# Altium footprint library ATROTECH.PcbLib: 334 footprints (part 16 of 21)
Each footprint in its own frame and in the unit in brackets; x right, y up, seen from the top. Pads: shape width x height; smd on the part's side, far side on the other; paste and mask are expansions set on the pad; w line width, h text height; cw(c..) or ccw(c..) is an arc to the next point about the centre after c.
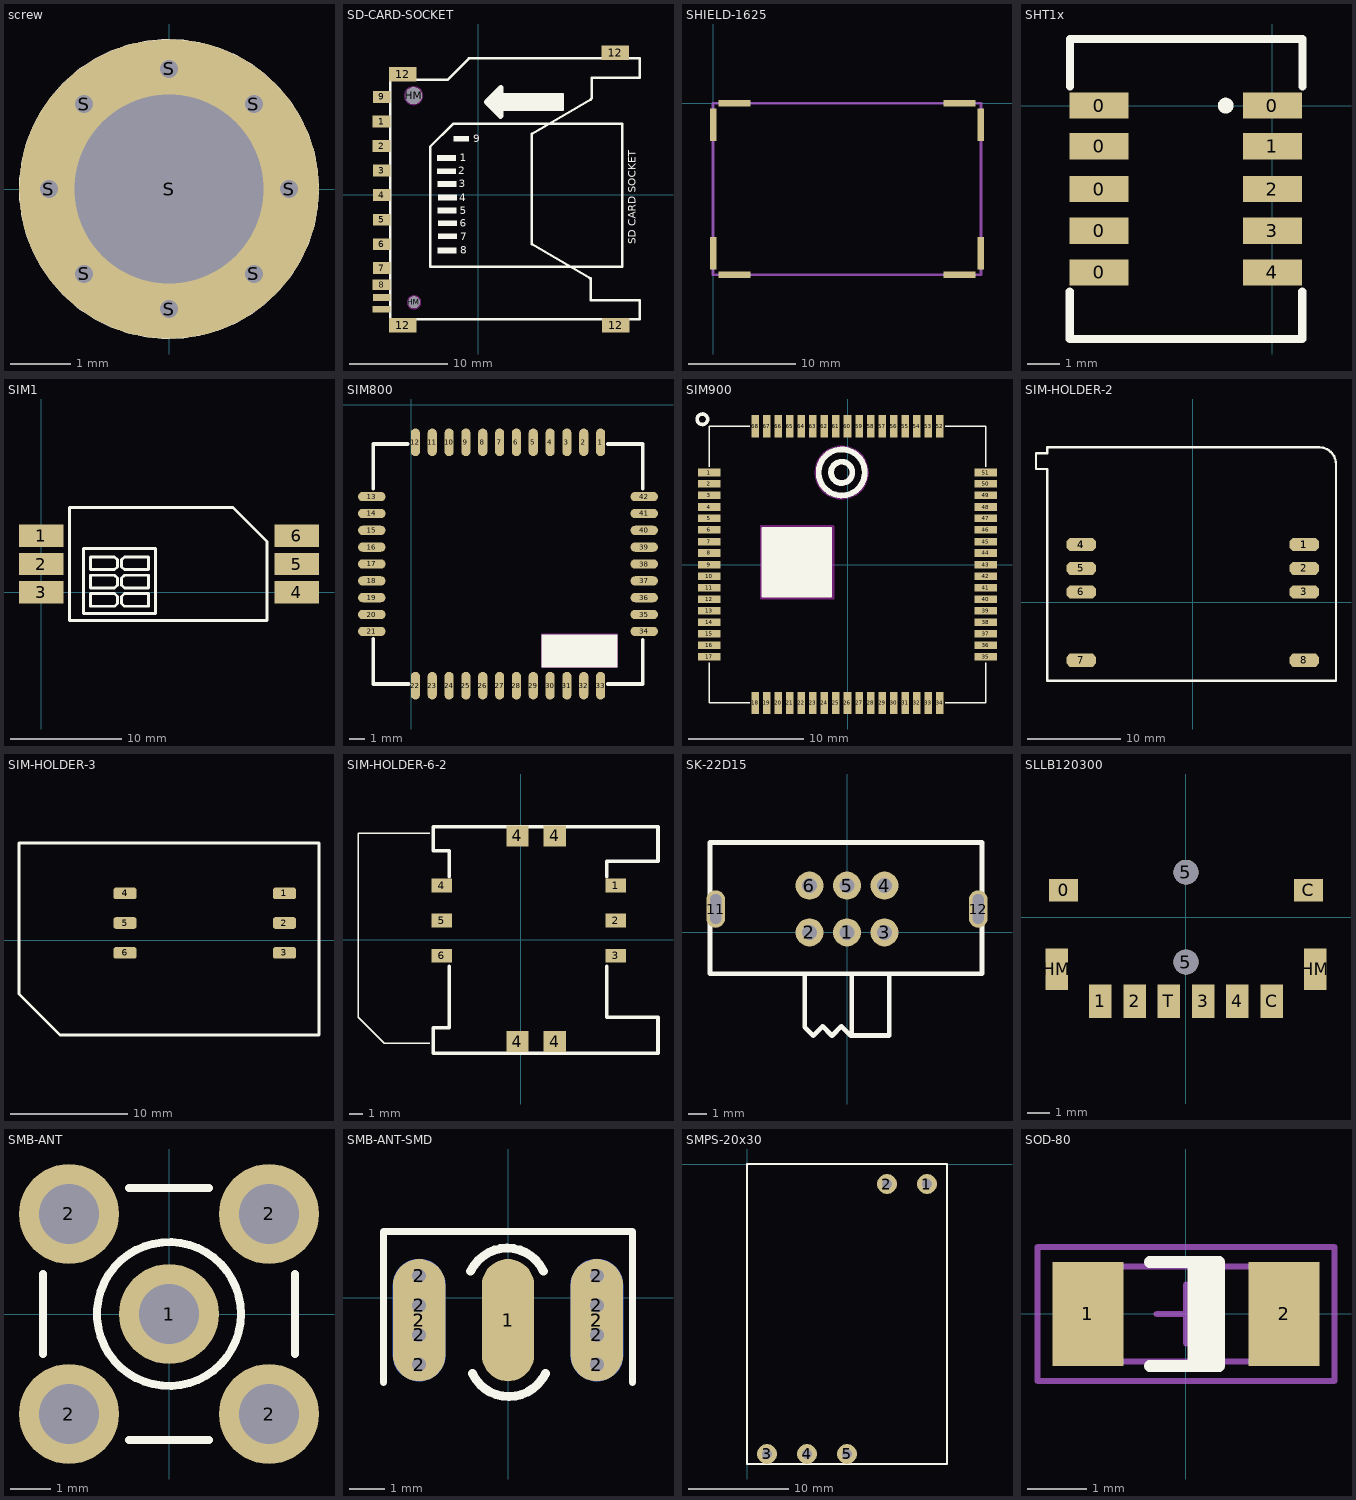
[diagram p15: the footprints below, top view; thin cyan lines are the x and y axes]

## screw [mm]
pads (9):
  round 0.6 hole 0.3: S(-2,0) S(-1.414,-1.414) S(-1.414,1.414) S(0,-2) S(0,2) S(1.414,-1.414) S(1.414,1.414) S(2,0)
  round 5 hole 3.15 mask+0.1: S(0,0)
Top Overlay:
  circle w1: c0,0 r2

## SD-CARD-SOCKET [mm]
pads (17):
  rect 1.8x1.2 smd: 1(-9.864,7.428) 2(-9.864,4.939) 3(-9.855,2.445) 4(-9.855,-0.055) 5(-9.855,-2.555) 6(-9.855,-5.055) 7(-9.855,-7.48) 9(-9.855,9.945)
  rect 1.8x1.1 smd: 8(-9.864,-9.184)
  rect 1.8x0.7 smd: 10(-9.855,-10.48) 11(-9.864,-11.673)
  rect 2.8x1.5 smd: 12(-7.721,-13.298) 12(-7.721,12.254) 12(13.919,14.438) 12(13.97,-13.298)
  round 1.7 hole 1.7: HM(-6.604,10.07)
  round 1.2 hole 1.2: HM(-6.564,-10.962)
Top Overlay:
  rectangle: -4.183,-5.971 -2.247,-5.397
  rectangle: -4.165,-1.903 -2.229,-1.329
  rectangle: -4.129,-0.577 -2.193,-0.003
  rectangle: -4.129,-3.193 -2.193,-2.62
  rectangle: -4.129,-4.519 -2.193,-3.946
  rectangle: -4.165,0.785 -2.229,1.359
  rectangle: -4.2,2.076 -2.265,2.649
  rectangle: -4.2,3.438 -2.265,4.011
  rectangle: -2.552,5.409 -0.975,5.983
  rectangle: 2.287,8.617 8.56,9.029
  rectangle: 2.287,9.334 8.56,10.212
  rectangle: 1.328,8.904 1.911,9.477
  rectangle: 1.328,9.477 2.018,9.952
  rectangle: 1.051,9.173 1.875,9.782
  rectangle: 1.875,8.277 2.287,9.173
  rectangle: 1.57,8.599 2.287,10.409
  rectangle: 2.287,8.922 8.56,9.872
  lines w0.254: -2.014,7.201 -2.588,7.201 ; 2.287,10.158 2.341,10.212 8.56,10.212 8.56,8.617 2.52,8.617 2.466,8.671 ; 5.436,-5.03 5.436,6.17 11.43,9.67 ; 5.436,-5.018 11.43,-8.53 ; 11.272,-8.479 11.43,-8.637 11.43,-10.679 ; 11.379,9.67 11.537,9.828 11.537,11.87 16.436,11.87 16.436,13.843 16.409,13.87 -0.965,13.87 -0.965,13.859 -3.154,11.67 -8.964,11.67 -8.964,-12.689 -8.95,-12.703 16.436,-12.703 16.436,-10.73 11.436,-10.73 ; -2.588,7.201 -4.917,4.872 -4.917,-7.351 -2.838,-7.351 14.653,-7.351 14.653,7.201 -0.473,7.201 -2.588,7.201 ; 2.287,8.922 2.287,9.872 8.56,9.872 8.56,8.922 2.287,8.922
  lines w0.5: 2.287,8.008 2.287,10.911
  lines w0.508: 2.251,7.972 0.8,9.424 2.287,10.911
  text "9" at -0.507,5.308 h0.76
  text "8" at -1.871,-6.025 h0.76
  text "7" at -1.871,-4.663 h0.76
  text "6" at -1.907,-3.265 h0.76
  text "5" at -1.907,-2.01 h0.76
  text "4" at -1.978,-0.684 h0.76
  text "3" at -2.014,0.75 h0.76
  text "2" at -2.05,2.076 h0.76
  text "1" at -1.907,3.402 h0.76
  text "SD CARD SOCKET" at 16.015,-5.057 h0.76
Keep-Out Layer:
  circle w0.254: c-6.604,10.07 r0.85
  circle w0.254: c-6.564,-10.962 r0.6
Mechanical 1:
  text "Data1" at -0.831,-6.061 h0.76
  text "Data OUT" at -0.903,-4.627 h0.76
  text "CLK" at -0.903,-1.903 h0.76
  text "VSS2" at -0.975,-3.337 h0.76
  text "Data IN" at -0.975,2.04 h0.76
  text "VDD" at -1.046,-0.541 h0.76
  text "VSS1" at -1.046,0.678 h0.76
  text "CS" at -0.975,3.402 h0.76
  text "Data2" at -0.831,5.338 h0.76
3D body "socket_a-sd-09-c-0-7-3.stp": height 3.3, standoff -0.85, extent -9.906,-13.509 16.45,14.525

## SHIELD-1625 [mm]
pads (8):
  rect 0.6x3 smd: 0(0,-14) 0(0,-2) 0(25,-14) 0(25,-2)
  rect 3x0.6 smd: 0(2,-16) 0(2,0) 0(23,-16) 0(23,0)
Mechanical 1:
  lines w0.254: 0,-16 0,0 25,0 25,-16 0,-16

## SHT1x [mm]
pads (10):
  rect 1.8x0.8 smd: 0(-5.28,-5.08) 0(-5.28,-3.81) 0(-5.28,-2.54) 0(-5.28,-1.24) 0(-5.28,0) 0(0,0) 1(0,-1.24) 2(0,-2.54) 3(0,-3.81) 4(0,-5.08)
Top Overlay:
  circle w0.254: c-1.422,0 r0.114
  lines w0.254: -6.172,-5.664 -6.172,-7.109 0.908,-7.109 0.908,-5.664 ; -6.166,0.584 -6.166,2.029 0.914,2.029 0.914,0.584

## SIM1 [mm]
pads (6):
  rect 4x2 smd: 1(0,5.08) 2(0,2.54) 3(0,0) 4(23,0) 5(23,2.54) 6(23,5.08)
Top Overlay:
  lines w0.254: 2.54,-2.54 20.32,-2.54 20.32,4.572 17.272,7.62 2.54,7.62 2.54,-2.54 ; 3.81,-1.905 10.287,-1.905 10.287,3.937 3.81,3.937 3.81,-1.905 ; 4.445,-1.27 4.445,-0.127 6.604,-0.127 6.858,-0.381 6.858,-1.016 6.604,-1.27 4.445,-1.27 ; 4.445,0.381 4.445,1.524 6.604,1.524 6.858,1.27 6.858,0.635 6.604,0.381 4.445,0.381 ; 4.445,2.032 6.604,2.032 6.858,2.286 6.858,2.921 6.604,3.175 4.445,3.175 4.445,2.032 ; 7.239,-1.016 7.239,-0.381 7.493,-0.127 9.652,-0.127 9.652,-1.27 7.493,-1.27 7.239,-1.016 ; 7.239,0.635 7.493,0.381 9.652,0.381 9.652,1.524 7.493,1.524 7.239,1.27 7.239,0.635 ; 7.239,2.286 7.493,2.032 9.652,2.032 9.652,3.175 7.493,3.175 7.239,2.921 7.239,2.286

## SIM800 [mm]
pads (42):
  oval 0.6x1.8 smd: 1(12.363,-2.44) 2(11.263,-2.44) 3(10.163,-2.44) 4(9.063,-2.44) 5(7.963,-2.44) 6(6.863,-2.44) 7(5.763,-2.44) 8(4.663,-2.44) 9(3.563,-2.44) 10(2.463,-2.44) 11(1.363,-2.44) 12(0.263,-2.44) 22(0.263,-18.34) 23(1.363,-18.34) 24(2.463,-18.34) 25(3.563,-18.34) 26(4.663,-18.34) 27(5.763,-18.34) 28(6.863,-18.34) 29(7.963,-18.34) 30(9.063,-18.34) 31(10.163,-18.34) 32(11.263,-18.34) 33(12.363,-18.34)
  oval 1.8x0.6 smd: 13(-2.587,-5.99) 14(-2.587,-7.09) 15(-2.587,-8.19) 16(-2.587,-9.29) 17(-2.587,-10.39) 18(-2.587,-11.49) 19(-2.587,-12.59) 20(-2.587,-13.69) 21(-2.587,-14.79) 34(15.213,-14.79) 35(15.213,-13.69) 36(15.213,-12.59) 37(15.213,-11.49) 38(15.213,-10.39) 39(15.213,-9.29) 40(15.213,-8.19) 41(15.213,-7.09) 42(15.213,-5.99)
Top Overlay:
  rectangle: 8.509,-17.136 13.459,-14.986
  lines w0.254: -2.487,-15.293 -2.487,-18.24 -0.175,-18.24 ; -2.487,-5.461 -2.487,-2.54 -0.254,-2.54 ; 12.827,-18.24 15.113,-18.24 15.113,-15.367 ; 12.827,-2.54 15.113,-2.54 15.113,-5.461
Keep-Out Layer:
  lines w0.1: 8.509,-17.145 13.462,-17.145 13.462,-14.986 8.509,-14.986 8.509,-17.145
3D body "User Library-SIM800C.step": height 2.3, standoff -0.01, extent -2.45,-18.264 15.15,-2.564

## SIM900 [mil]
pads (68):
  rect 76x26 smd: 1(-472.72,314.72) 2(-472.72,275.72) 3(-472.72,236.72) 4(-472.72,196.72) 5(-472.72,157.72) 6(-472.72,118.72) 7(-472.72,78.72) 8(-472.72,39.72) 9(-472.72,-0.28) 10(-472.72,-39.65) 11(-472.72,-79.02) 12(-472.72,-118.39) 13(-472.72,-157.76) 14(-472.72,-197.13) 15(-472.72,-236.5) 16(-472.72,-275.87) 17(-472.72,-315.24) 35(472.72,-315.24) 36(472.72,-275.87) 37(472.72,-236.5) 38(472.72,-197.13) 39(472.72,-157.76) 40(472.72,-118.39) 41(472.72,-79.02) 42(472.72,-39.65) 43(472.72,-0.28) 44(472.72,39.72) 45(472.72,78.72) 46(472.72,118.72) 47(472.72,157.72) 48(472.72,196.72) 49(472.72,236.72) 50(472.72,275.72) 51(472.72,314.72)
  rect 26x76 smd: 18(-315.24,-472.72) 19(-275.87,-472.72) 20(-236.5,-472.72) 21(-197.13,-472.72) 22(-157.76,-472.72) 23(-118.39,-472.72) 24(-79.02,-472.72) 25(-39.65,-472.72) 26(-0.28,-472.72) 27(39.72,-472.72) 28(78.72,-472.72) 29(118.72,-472.72) 30(157.72,-472.72) 31(196.72,-472.72) 32(236.72,-472.72) 33(275.72,-472.72) 34(314.72,-472.72) 52(314.72,472.72) 53(275.72,472.72) 54(236.72,472.72) 55(196.72,472.72) 56(157.72,472.72) 57(118.72,472.72) 58(78.72,472.72) 59(39.72,472.72) 60(-0.28,472.72) 61(-39.65,472.72) 62(-79.02,472.72) 63(-118.39,472.72) 64(-157.76,472.72) 65(-197.13,472.72) 66(-236.5,472.72) 67(-275.87,472.72) 68(-315.24,472.72)
Top Overlay:
  circle w19.68: c-20,315 r36.4
  circle w12: c-496.34,496.72 r18
  circle w19.68: c-20,315 r78.74
  rectangle: -291.62,-110.52 -55.4,125.72
  lines w5: -472.72,-334.93 -472.72,-472.72 -334.93,-472.72 ; -472.72,334.72 -472.72,472.72 -334.93,472.72 ; 334.72,-472.72 472.72,-472.72 472.72,-334.93 ; 334.72,472.72 472.72,472.72 472.72,334.72 ; -291.62,-110.52 -55.4,-110.52 -55.4,125.72 -291.62,125.72 -291.62,-110.52
Keep-Out Layer:
  circle w5: c-19.96,314.72 r90.04
  lines w10: -295,-115 -50,-115 -50,130 -295,130 -295,-115
Mechanical 2:
Mechanical 4:
Mechanical 16:
3D body "SIMCOM_SIM900.STEP": height 118.5, standoff 0.16, extent -474.4,-474.41 474.42,474.41

## SIM-HOLDER-2 [mm]
pads (10):
  oct 3.2x1.4 smd: 1(11.954,6.2) 1(11.954,6.2) 2(11.954,3.66) 3(11.954,1.12) 4(-11.954,6.2) 4(-11.954,6.2) 5(-11.954,3.66) 6(-11.954,1.12) 7(-11.954,-6.2) 8(11.954,-6.2)
Top Overlay:
  lines w0.254: -15.634,14.304 -16.802,14.304 -16.802,15.981 -15.583,15.981 -15.583,16.619 13.573,16.619 cw(c13.573,14.832) 15.36,14.832 15.36,-8.381 -15.583,-8.381 -15.583,14.304
3D body "912283001.stp": height 3.1, standoff 0, extent -16.84,-8.381 15.36,16.619

## SIM-HOLDER-3 [mm]
pads (7):
  rrect50% 2x1 smd: 1(-4.946,4) 2(-4.946,1.46) 3(-4.946,-1.08) 4(-18.554,4) 4(-18.554,4) 5(-18.554,1.46) 6(-18.554,-1.08)
Top Overlay:
  lines w0.254: -27.6,-4.6 -27.6,8.3 -2,8.3 -2,-8.1 -24.1,-8.1 -27.6,-4.6
3D body "User Library-Sim Card Holder.step": height 1.8, standoff 0, extent -18.3,-8.1 -2,8.3
3D body: height 1.5, standoff 0.8, extent -27.6,-7.4 -2.6,7.6

## SIM-HOLDER-6-2 [mm]
pads (10):
  rect 1.5x1 smd: 1(6.858,3.937) 2(6.858,1.397) 3(6.858,-1.143) 4(-5.742,3.937) 5(-5.742,1.397) 6(-5.742,-1.143)
  rect 1.6x1.5 smd: 4(-0.254,-7.366) 4(-0.254,7.534) 4(2.446,-7.366) 4(2.446,7.534)
Top Overlay:
  lines w0.1: -6.604,-7.493 -9.906,-7.493 -11.811,-5.588 -11.811,7.747 -6.604,7.747
  lines w0.254: -5.207,-1.905 -5.207,-6.35 -6.372,-6.35 -6.372,-8.2 9.928,-8.2 9.928,-5.588 6.223,-5.588 6.223,-1.905 ; -5.207,4.572 -5.207,6.477 -6.372,6.477 -6.372,8.2 9.928,8.2 9.928,5.715 6.223,5.715 6.223,4.572
3D body "693010020611.stp": height 1.8, standoff 0, extent -6.372,-8.2 9.928,8.2

## SK-22D15 [mm] "2P2T SWITCH"
height 8.5
pads (8):
  round 1.5 hole 0.8: 1(0,0) 2(-2,0) 3(2,0) 4(2,2.5) 5(0,2.5) 6(-2,2.5)
  oval 1x2 hole 0.6 slot 1.6 at 90 deg: 11(-7,1.25) 12(7,1.25)
Top Overlay:
  lines w0.254: -2.25,-5 -2.25,-5.05 ; -2.25,-2.2 -2.25,-5.05 ; 0.2,-5.5 -0.3,-5 -0.8,-5.5 ; 0.25,-2.2 0.25,-5.5 2.25,-5.5 2.25,-2.2 ; -2.25,-5.05 -1.8,-5.5 -1.3,-5 -0.8,-5.5 ; -0.8,-5.5 -0.8,-5.5 ; -7.3,-2.2 -7.3,4.8 7.2,4.8 7.2,-2.2 -7.3,-2.2

## SLLB120300 [mm]
pads (12):
  rect 1.3x1 smd: 0(-5.45,1.2) C(5.45,1.2)
  rect 1x1.5 smd: 1(-3.81,-3.75) 2(-2.286,-3.75) 3(0.762,-3.75) 4(2.286,-3.75) C(3.81,-3.75) T(-0.762,-3.75)
  round 1.1 hole 1.1: 5(0,-2) 5(0,2)
  rect 1x1.85 smd: HM(-5.75,-2.325) HM(5.75,-2.325)
3D body "SLLB120300.STEP": height 3, standoff -0.65, extent -7.299,-4.206 7.299,7.488

## SMB-ANT [mm]
pads (5):
  round 2.5 hole 1.5: 1(0,0) 2(-2.5,-2.5) 2(-2.5,2.5) 2(2.5,-2.5) 2(2.5,2.5)
Top Overlay:
  circle w0.2: c0,0 r1.8
  lines w0.2: -3.15,-1 -3.15,1 ; -1,-3.15 1,-3.15 ; -1,3.15 1,3.15 ; 3.15,-1 3.15,1
Mechanical 1:
  circle w0.025: c0,0 r0.2
  circle w0.025: c0,0 r1.05
  circle w0.025: c0,0 r1.8
3D body "SMB.STEP": height 9.9, standoff -4, extent -2.625,-11.373 2.575,2.627

## SMB-ANT-SMD [mm]
pads (13):
  oval 1.5x3.5 smd: 1(0,-0.635) 2(-2.54,-0.635) 2(2.54,-0.635)
  round 0.7 hole 0.4: 2(-2.54,-1.905) 2(-2.54,-1.058) 2(-2.54,-0.212) 2(-2.54,0.635) 2(2.54,-1.905) 2(2.54,-1.058) 2(2.54,-0.212) 2(2.54,0.635)
  oval 1.5x3.5 smd far side: 2(-2.54,-0.635) 2(2.54,-0.635)
Top Overlay:
  lines w0.2: -3.556,-2.413 -3.556,1.905 3.556,1.905 3.556,-2.413
  lines w0.254: -1.069,0.762 cw(c-0.026,0.276) 1.016,0.762 ; -1.016,-2.159 ccw(c0.026,-1.673) 1.069,-2.159
Mechanical 1:
  circle w0.025: c0,-0.381 r0.2
3D body "User Library-sma-3.step": height 3.84, standoff -2.57, extent -3.073,-1.625 3.327,16.675

## SMPS-20x30 [mm]
pads (5):
  round 2 hole 1: 1(18,-2) 2(14,-2) 3(2,-29) 4(6,-29) 5(10,-29)
Top Overlay:
  lines w0.2: 0,-30 20,-30 20,0 0,0 0,-30

## SOD-80 [mm] "MINI MELF"
pads (2):
  rect 1.2x1.75 smd: 1(-1.65,0) 2(1.65,0)
Top Overlay:
  region: 0.573,0.875 0.023,0.875 0.023,-0.875 0.573,-0.875
  lines w0.2: -0.61,-0.875 0.559,-0.875 0.559,0.875 -0.61,0.875
Mechanical 13:
  rectangle: -1.85,-0.8 -1.352,0.8
  lines w0.1: -1.85,-0.8 1.85,-0.8 1.85,0.8 -1.85,0.8 -1.85,-0.8
Mechanical 15:
  lines w0.1: -0.5,0 0.5,0 ; 0,-0.5 0,0.5 ; -2.5,-1.125 2.5,-1.125 2.5,1.125 -2.5,1.125 -2.5,-1.125
3D body "User Library-Diode MELF.STEP": height 1.55, standoff 0.05, extent -1.775,-0.75 1.725,0.75